# Altium footprint library PCB_ConnectorHDR.PcbLib: 128 footprints (part 5 of 8)
Each footprint in its own frame and in the unit in brackets; x right, y up, seen from the top. Pads: shape width x height; smd on the part's side, far side on the other; paste and mask are expansions set on the pad; w line width, h text height; cw(c..) or ccw(c..) is an arc to the next point about the centre after c.
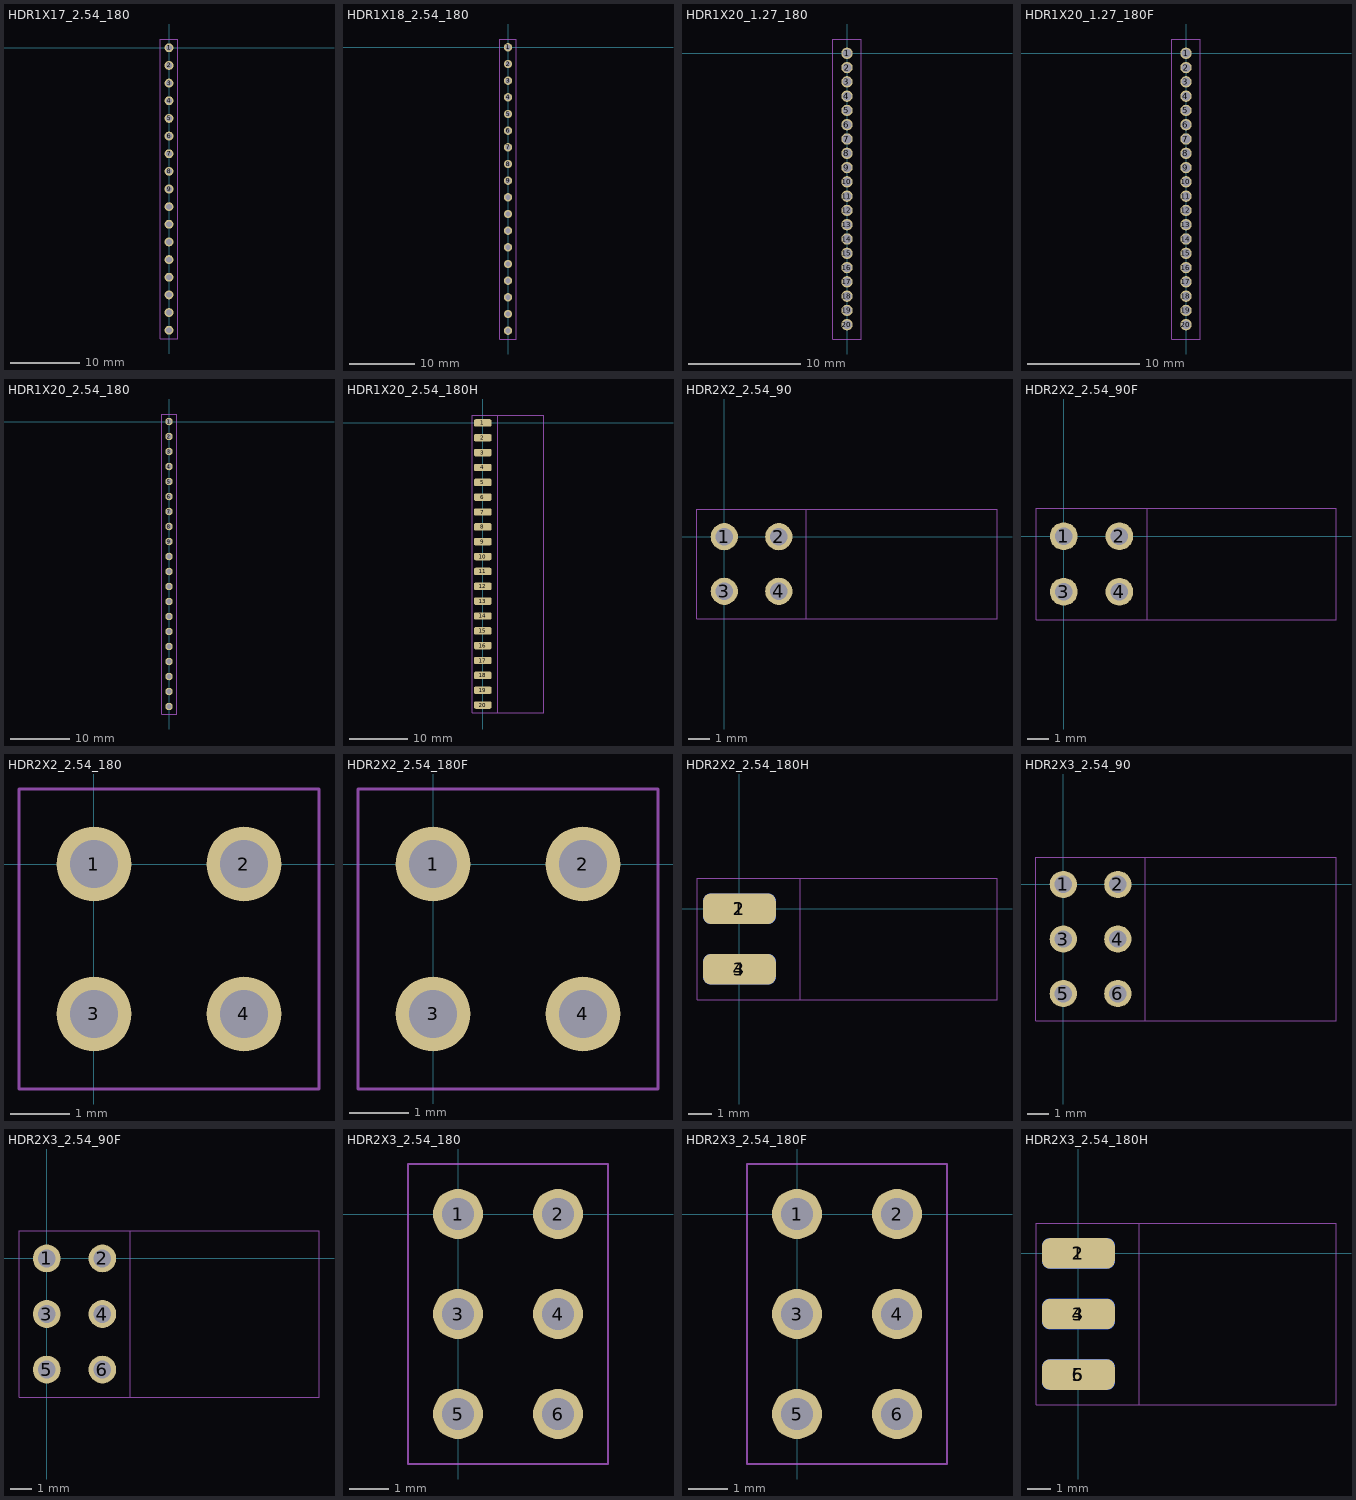
[diagram p4: the footprints below, top view; thin cyan lines are the x and y axes]

## HDR1X17_2.54_180 [mil]
height 169.29
pads (17):
  round 50 hole 32: 1(0,0) 2(0,-100) 3(0,-200) 4(0,-300) 5(0,-400) 6(0,-500) 7(0,-600) 8(0,-700) 9(0,-800) 10(0,-900) 11(0,-1000) 12(0,-1100) 13(0,-1200) 14(0,-1300) 15(0,-1400) 16(0,-1500) 17(0,-1600)
Mechanical 13:
  lines w2: -50,-1650 50,-1650 50,50 -50,50 -50,-1650
T-Component:
  lines w2: -50,-1650 50,-1650 50,50 -50,50 -50,-1650
3D body "pin_header_aw140-eg-g17d.stp": height 322.83, standoff -118.11, extent -49.18,-1650 49.18,50

## HDR1X18_2.54_180 [mil]
height 169.29
pads (18):
  round 50 hole 32: 1(0,0) 2(0,-100) 3(0,-200) 4(0,-300) 5(0,-400) 6(0,-500) 7(0,-600) 8(0,-700) 9(0,-800) 10(0,-900) 11(0,-1000) 12(0,-1100) 13(0,-1200) 14(0,-1300) 15(0,-1400) 16(0,-1500) 17(0,-1600) 18(0,-1700)
Mechanical 13:
  lines w2: -50,-1750 -50,50 50,50 50,-1750 -50,-1750
T-Component:
  lines w2: -50,-1750 -50,50 50,50 50,-1750 -50,-1750
3D body "pin_header_aw140-eg-g18d.stp": height 322.83, standoff -118.11, extent -49.18,-1750 49.18,50

## HDR1X20_1.27_180 [mil]
height 169.29
pads (20):
  round 40 hole 30: 1(0,0) 2(0,-50) 3(0,-100) 4(0,-150) 5(0,-200) 6(0,-250) 7(0,-300) 8(0,-350) 9(0,-400) 10(0,-450) 11(0,-500) 12(0,-550) 13(0,-600) 14(0,-650) 15(0,-700) 16(0,-750) 17(0,-800) 18(0,-850) 19(-0.01,-900) 20(-0.01,-950)
Mechanical 13:
  lines w2: -50,-1000 -50,50 50,50 50,-1000 -50,-1000
T-Component:
  lines w2: -50,-1000 -50,50 50,50 50,-1000 -50,-1000
3D body "pin_header_a-sl127-eg-g20d.stp": height 210.24, standoff -102.36, extent -49.65,-975 48.77,25

## HDR1X20_1.27_180F [mil]
height 169.29
pads (20):
  round 40 hole 30: 1(0,0) 2(0,-50) 3(0,-100) 4(0,-150) 5(0,-200) 6(0,-250) 7(0,-300) 8(0,-350) 9(0,-400) 10(0,-450) 11(0,-500) 12(0,-550) 13(0,-600) 14(0,-650) 15(0,-700) 16(0,-750) 17(0,-800) 18(0,-850) 19(-0.01,-900) 20(-0.01,-950)
Mechanical 13:
  lines w2: -50,-1000 -50,50 50,50 50,-1000 -50,-1000
T-Component:
  lines w2: -50,-1000 -50,50 50,50 50,-1000 -50,-1000
3D body "female_header_a-bl127-eg-g20d.stp": height 133.86, standoff -94.49, extent -35.87,-982.88 35,32.88

## HDR1X20_2.54_180 [mil]
height 169.29
pads (20):
  round 50 hole 32: 1(0,0) 2(0,-100) 3(0,-200) 4(0,-300) 5(0,-400) 6(0,-500) 7(0,-600) 8(0,-700) 9(0,-800) 10(0,-900) 11(0,-1000) 12(0,-1100) 13(0,-1200) 14(0,-1300) 15(0,-1400) 16(0,-1500) 17(0,-1600) 18(0,-1700) 19(0,-1800) 20(0,-1900)
Mechanical 13:
  lines w2: -50,-1950 50,-1950 50,50 -50,50 -50,-1950
T-Component:
  lines w2: -50,-1950 50,-1950 50,50 -50,50 -50,-1950
3D body "pin_header_aw140-eg-g20d.stp": height 322.83, standoff -118.11, extent -49.32,-1951.06 49.05,48.94

## HDR1X20_2.54_180H [mil]
height 169.29
pads (20):
  rrect50% 120x50 smd: 1(0,0) 2(0,-100) 3(0,-200) 4(0,-300) 5(0,-400) 6(0,-500) 7(0,-600) 8(0,-700) 9(0,-800) 10(0,-900) 11(0,-1000) 12(0,-1100) 13(0,-1200) 14(0,-1300) 15(0,-1400) 16(0,-1500) 17(0,-1600) 18(0,-1700) 19(0,-1800) 20(0,-1900)
Mechanical 13:
  lines w2: -70,-1950 -70,50 410,50 410,-1950 -70,-1950
T-Component:
  lines w2: -70,-1950 -70,50 100,50 100,-1950 -70,-1950
3D body "pin_header_aw140-eg-g20d.stp": height 49.32, standoff -49.05, extent -35,-1950 405.94,50

## HDR2X2_2.54_90 [mil]
height 169.29
pads (4):
  round 50 hole 32: 1(0,0) 2(100,0) 3(0,-100) 4(100,-100)
Mechanical 13:
  lines w2: -50,-150 500,-150 500,50 -50,50 -50,-150
T-Component:
  lines w2: -50,-150 150,-150 150,50 -50,50 -50,-150
3D body "pin_header_awl254-da-g04d.stp": height 198.43, standoff -116.54, extent -10,-150 497.09,50

## HDR2X2_2.54_90F [mil]
height 169.29
pads (4):
  round 50 hole 32: 1(0,0) 2(100,0) 3(0,-100) 4(100,-100)
Mechanical 13:
  lines w2: -50,-150 -50,50 490,50 490,-150 -50,-150
T-Component:
  lines w2: -50,-150 150,-150 150,50 -50,50 -50,-150
3D body "female_header_a-bl254-da-g04d.stp": height 198.43, standoff -124.41, extent -10,-154.92 486.06,54.92

## HDR2X2_2.54_180 [mil]
height 169.29
pads (4):
  round 50 hole 32: 1(0,0) 2(100,0) 3(0,-100) 4(100,-100)
Mechanical 13:
  lines w2: -50,-150 150.01,-150 150.01,50 -50,50 -50,-150
T-Component:
  lines w2: -50,-150 -50,50 150,50 150,-150 -50,-150
3D body "pin_header_awl254-dg-g04d.stp": height 334.65, standoff -118.11, extent -49.99,-150 150.01,50

## HDR2X2_2.54_180F [mil]
height 169.29
pads (4):
  round 50 hole 32: 1(0,0) 2(100,0) 3(0,-100) 4(100,-100)
Mechanical 13:
  lines w2: -50,-150 150,-150 150,50 -50,50 -50,-150
T-Component:
  lines w2: -50,-150 -50,50 150,50 150,-150 -50,-150
3D body "female_header_a-bl254-dg-g04d.stp": height 334.65, standoff -125.98, extent -48.42,-154.93 148.43,54.92

## HDR2X2_2.54_180H [mil]
height 169.29
pads (4):
  rrect50% 120x50 smd: 1(0,0) 3(0,-100)
  rrect50% 120x50 smd far side: 2(0,0) 4(0,-100)
Mechanical 13:
  lines w2: -70,-150 -70,50 425,50 425,-150 -70,-150
T-Component:
  lines w2: -70,-150 -70,50 100,50 100,-150 -70,-150
B-Component:
  lines w2: -70,-150 -70,50 100,50 100,-150 -70,-150
3D body "pin_header_awl254-dg-g04d.stp": height 78, standoff -122, extent -38.11,-149.99 414.65,50.01

## HDR2X3_2.54_90 [mil]
height 169.29
pads (6):
  round 50 hole 32: 1(0,0) 2(100,0) 3(0,-100) 4(100,-100) 5(0,-200) 6(100,-200)
Mechanical 13:
  lines w2: -50,-250 500,-250 500,50 -50,50 -50,-250
T-Component:
  lines w2: -50,-250 -50,50 150,50 150,-250 -50,-250
3D body "pin_header_awl254-da-g06d.stp": height 198.43, standoff -116.54, extent -10,-250 497.09,50

## HDR2X3_2.54_90F [mil]
height 169.29
pads (6):
  round 50 hole 32: 1(0,0) 2(100,0) 3(0,-100) 4(100,-100) 5(0,-200) 6(100,-200)
Mechanical 13:
  lines w2: -50,-250 -50,50 490,50 490,-250 -50,-250
T-Component:
  lines w2: -50,-250 -50,50 150,50 150,-250 -50,-250
3D body "female_header_a-bl254-da-g06d.stp": height 198.43, standoff -124.41, extent -10,-254.92 486.06,54.92

## HDR2X3_2.54_180 [mil]
height 169.29
pads (6):
  round 50 hole 32: 1(0,0) 2(100,0) 3(0,-100) 4(100,-100) 5(0,-200) 6(100,-200)
Mechanical 13:
  lines w2: -50,-250 150,-250 150,50 -50,50 -50,-250
T-Component:
  lines w2: -50,-250 150,-250 150,50 -50,50 -50,-250
3D body "pin_header_awl254-dg-g06d.stp": height 334.65, standoff -118.11, extent -50,-249.99 150,50

## HDR2X3_2.54_180F [mil]
height 169.29
pads (6):
  round 50 hole 32: 1(0,0) 2(100,0) 3(0,-100) 4(100,-100) 5(0,-200) 6(100,-200)
Mechanical 13:
  lines w2: -50,-250 -50,50 150,50 150,-250 -50,-250
T-Component:
  lines w2: -50,-250 -50,50 150,50 150,-250 -50,-250
3D body "female_header_a-bl254-dg-g06d.stp": height 334.65, standoff -125.98, extent -48.42,-254.91 148.43,54.92

## HDR2X3_2.54_180H [mil]
height 169.29
pads (6):
  rrect50% 120x50 smd: 1(0,0) 3(0,-100) 5(0,-200)
  rrect50% 120x50 smd far side: 2(0,0) 4(0,-100) 6(0,-200)
Mechanical 13:
  lines w2: -70,-250 425,-250 425,50 -70,50 -70,-250
T-Component:
  lines w2: -70,-250 100,-250 100,50 -70,50 -70,-250
B-Component:
  lines w2: -70,-250 100,-250 100,50 -70,50 -70,-250
3D body "pin_header_awl254-dg-g06d.stp": height 78, standoff -122, extent -38.11,-249.99 414.65,50.01